# Altium footprint library Footprints.PcbLib: 67 footprints (part 1 of 5)
Each footprint in its own frame and in the unit in brackets; x right, y up, seen from the top. Pads: shape width x height; smd on the part's side, far side on the other; paste and mask are expansions set on the pad; w line width, h text height; cw(c..) or ccw(c..) is an arc to the next point about the centre after c.
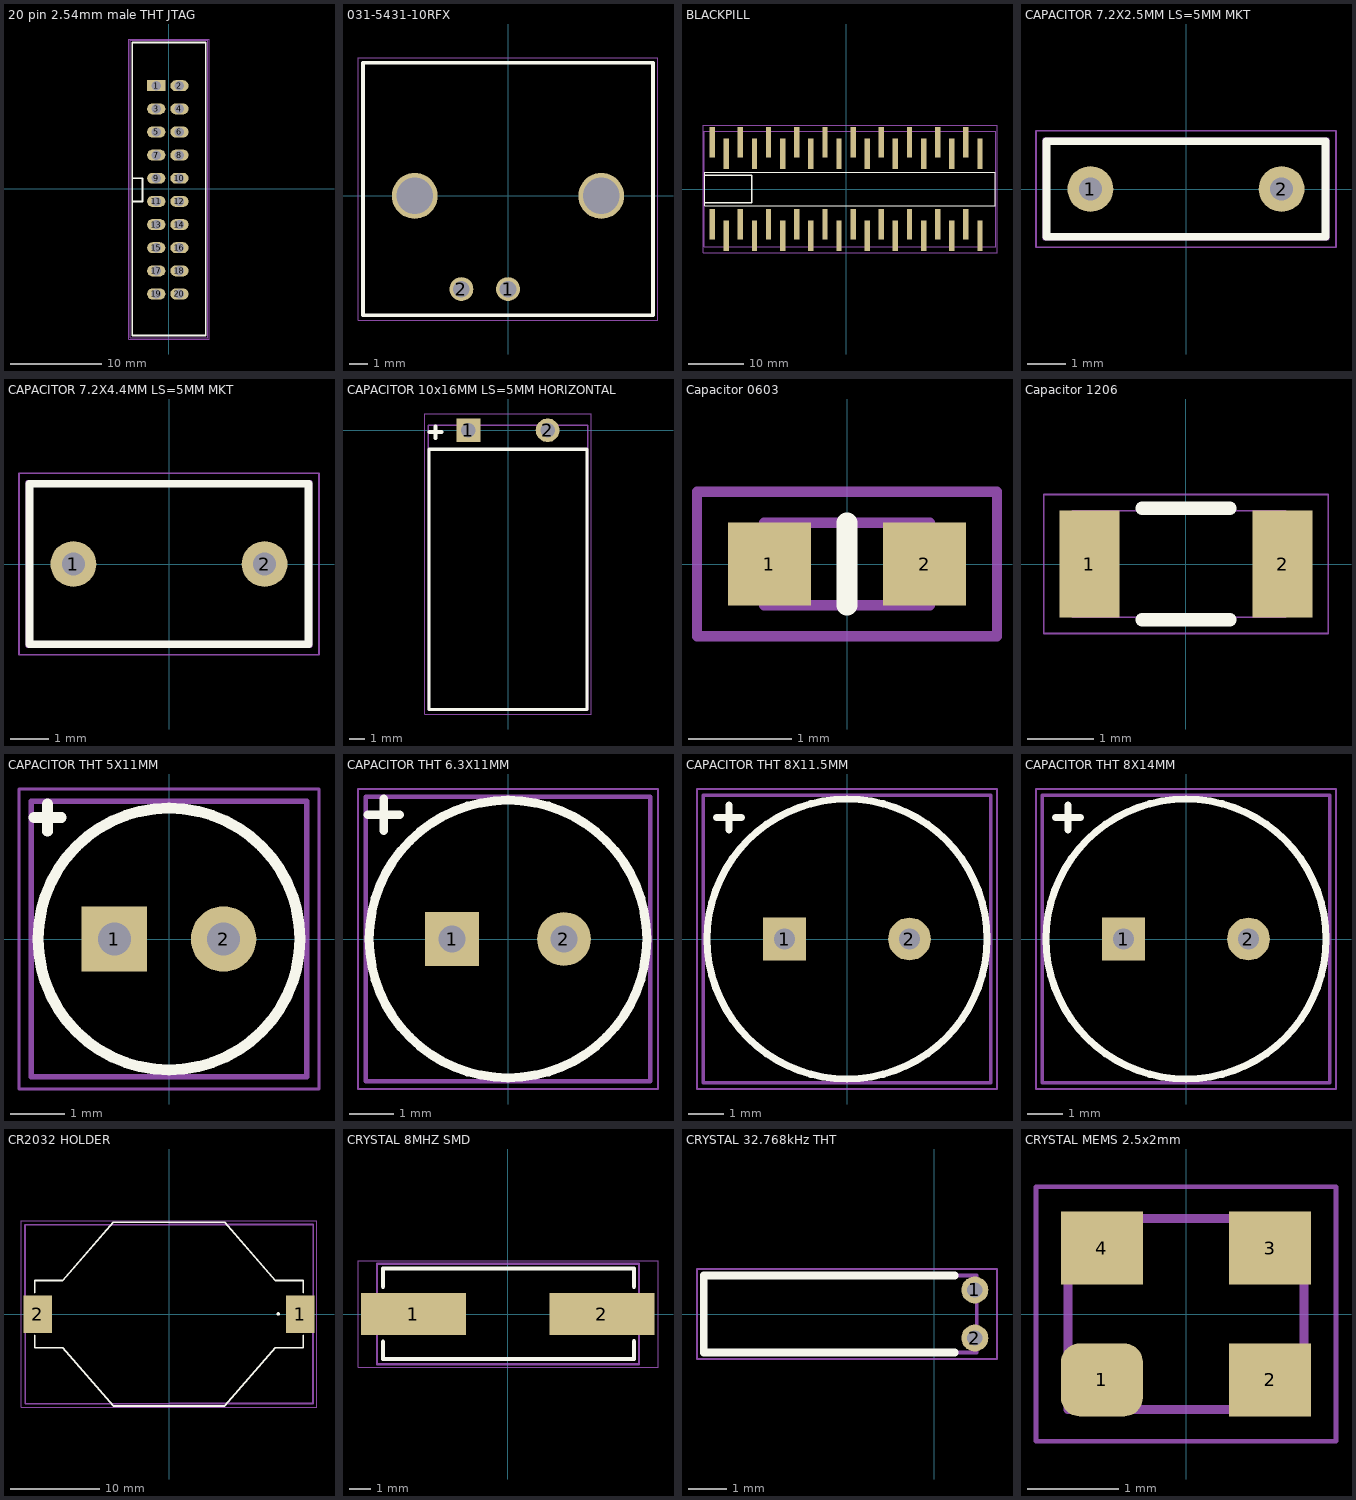
[diagram p0: the footprints below, top view; thin cyan lines are the x and y axes]

## 20 pin 2.54mm male THT JTAG [mm]
pads (20):
  rect 2x1.2 hole 1.02: 1(-1.4,11.325)
  oval 2x1.2 hole 1.02: 2(1.14,11.325) 3(-1.4,8.785) 4(1.14,8.785) 5(-1.4,6.245) 6(1.14,6.245) 7(-1.4,3.705) 8(1.14,3.705) 9(-1.4,1.165) 10(1.14,1.165) 11(-1.4,-1.375) 12(1.14,-1.375) 13(-1.4,-3.915) 14(1.14,-3.915) 15(-1.4,-6.455) 16(1.14,-6.455) 17(-1.4,-8.995) 18(1.14,-8.995) 19(-1.4,-11.535) 20(1.14,-11.535)
Top Overlay:
  lines w0.2: -3.937,-1.375 -2.912,-1.375 -2.912,1.165 -3.937,1.165 ; -4.025,-16.1 -4.025,16.075 4.025,16.075 4.025,-16.1 -4.025,-16.1
Placement:
  lines w0.1: -4.275,-16.35 -4.275,16.325 4.275,16.325 4.275,-16.35 -4.275,-16.35
  text "'.Designator'" at 0.6,-10 h1.8
Keep-Out:
  lines w0.05: -4.4,-16.475 -4.4,16.45 4.4,16.45 4.4,-16.475 -4.4,-16.475
3D body "idc-20_asm.STEP": height 8.5, standoff -3.7, extent -4.25,-16.375 4.25,16.325

## 031-5431-10RFX [mm]
pads (4):
  round 1.3 hole 0.9: 1(0,-5.08) 2(-2.54,-5.08)
  round 2.5 hole 2: ""(-5.08,0) ""(5.08,0)
Top Overlay:
  lines w0.2: -7.9,-6.5 7.9,-6.5 7.9,7.25 -7.9,7.25 -7.9,-6.5
Placement:
  lines w0.1: -7.9,-6.5 -7.9,7.25 7.9,7.25 7.9,-6.5 -7.9,-6.5
  text "'.Designator'" at -6.85,-0.675 h1.5
Keep-Out:
  lines w0.05: -8.175,-6.775 -8.175,7.525 8.175,7.525 8.175,-6.775 -8.175,-6.775
3D body "31-5431-10RFX.stp": height 16.71, standoff -4.08, extent -7.9,-6.5 7.9,28.2

## BLACKPILL [mm]
pads (40):
  rect 0.96x5.47 smd: 1(-24.13,-6.35) 2(-21.59,-8.446) 3(-19.05,-6.35) 4(-16.51,-8.446) 5(-13.97,-6.35) 6(-11.43,-8.446) 7(-8.89,-6.35) 8(-6.35,-8.446) 9(-3.81,-6.35) 10(-1.27,-8.446) 11(1.27,-6.35) 12(3.81,-8.446) 13(6.35,-6.35) 14(8.89,-8.446) 15(11.43,-6.35) 16(13.97,-8.446) 17(16.51,-6.35) 18(19.05,-8.446) 19(21.59,-6.35) 20(24.13,-8.446) 21(24.13,6.35) 22(21.59,8.446) 23(19.05,6.35) 24(16.51,8.446) 25(13.97,6.35) 26(11.43,8.446) 27(8.89,6.35) 28(6.35,8.446) 29(3.81,6.35) 30(1.27,8.446) 31(-1.27,6.35) 32(-3.81,8.446) 33(-6.35,6.35) 34(-8.89,8.446) 35(-11.43,6.35) 36(-13.97,8.446) 37(-16.51,6.35) 38(-19.05,8.446) 39(-21.59,6.35) 40(-24.13,8.446)
Top Overlay:
  lines w0.2: -25.475,-3 -25.475,3 26.925,3 26.925,-3 -25.475,-3
  lines w0.254: -25.425,-2.5 -17,-2.5 -17,2.5 -25.425,2.5
Placement:
  lines w0.1: -25.525,-10.4 26.975,-10.4 26.975,10.4 -25.525,10.4 -25.525,-10.4
  text "'.Designator'" at -21.25,-1.576 h6
Keep-Out:
  lines w0.05: -25.75,-11.45 27.2,-11.45 27.2,11.45 -25.75,11.45 -25.75,-11.45
3D body "User Library-minif4_board-1.step": height 14.66, standoff 9.6, extent -25.5,-10.395 27.04,10.385
3D body "10129380-910001ALF.stp": height 13.66, standoff 0, extent 0,4.983 25.4,9.813
3D body "10129380-910001ALF.stp": height 13.66, standoff 0, extent -25.4,4.983 0,9.813
3D body "10129380-910001ALF.stp": height 13.66, standoff 0, extent -25.4,-9.813 0,-4.983
3D body "10129380-910001ALF.stp": height 13.66, standoff 0, extent 0,-9.813 25.4,-4.983

## CAPACITOR 7.2X2.5MM LS=5MM MKT [mm]
pads (2):
  round 1.2 hole 0.6: 1(-2.5,0) 2(2.5,0)
Top Overlay:
  lines w0.2: -3.65,-1.25 3.65,-1.25 3.65,1.25 -3.65,1.25 -3.65,-1.25
Placement:
  lines w0.1: -3.7,-1.3 3.7,-1.3 3.7,1.3 -3.7,1.3 -3.7,-1.3
  text "'.Designator'" at -2.775,-0.275 h0.6
Keep-Out:
  lines w0.05: -3.925,-1.525 -3.925,1.525 3.925,1.525 3.925,-1.525 -3.925,-1.525
3D body "R82DC3220AA60K.step": height 6.6, standoff -5.5, extent -3.7,-1.3 3.7,1.305

## CAPACITOR 7.2X4.4MM LS=5MM MKT [mm]
pads (2):
  round 1.2 hole 0.6: 1(-2.5,0) 2(2.5,0)
Top Overlay:
  lines w0.2: -3.65,-2.1 3.65,-2.1 3.65,2.1 -3.65,2.1 -3.65,-2.1
Placement:
  lines w0.1: -3.7,-2.15 3.7,-2.15 3.7,2.15 -3.7,2.15 -3.7,-2.15
  text "'.Designator'" at -2.775,-0.275 h0.6
Keep-Out:
  lines w0.05: -3.925,-2.375 -3.925,2.375 3.925,2.375 3.925,-2.375 -3.925,-2.375
3D body "R82DC3220AA60K.step": height 6.6, standoff -5.5, extent -3.7,-1.3 3.7,1.305

## CAPACITOR 10x16MM LS=5MM HORIZONTAL [mm]
pads (2):
  rect 1.5x1.5 hole 0.9: 1(-2.5,0)
  round 1.5 hole 0.9: 2(2.5,0)
Top Overlay:
  lines w0.2: -4.975,-17.625 4.975,-17.625 4.975,-1.2 -4.975,-1.2 -4.975,-17.625
  lines w0.254: -4.95,-0.125 -4.2,-0.125 ; -4.575,-0.5 -4.575,-0.125 -4.575,0.25
Placement:
  lines w0.1: -5.025,-17.675 5.025,-17.675 5.025,0.325 -5.025,0.325 -5.025,-17.675
  text "'.Designator'" at 0.85,-15.4 h1.8
Keep-Out:
  lines w0.05: -5.25,-17.9 -5.25,1.025 5.25,1.025 5.25,-17.9 -5.25,-17.9
3D body "User Library-Cap electro 10x16x5_0mm RA.step": height 12.03, standoff -1.68, extent -5.025,-17.675 5.025,0.313

## Capacitor 0603 [mm]
pads (2):
  rect 0.8x0.8 smd: 1(-0.75,0) 2(0.75,0)
Top Overlay:
  lines w0.2: 0,-0.4 0,0.4
Placement:
  lines w0.1: -0.8,-0.4 0.8,-0.4 0.8,0.4 -0.8,0.4 -0.8,-0.4
  text "'.Designator'" at -0.225,-0.025 h0.3
Keep-Out:
  lines w0.1: -1.45,-0.7 -1.45,0.7 -0.675,0.7 1.45,0.7 1.45,-0.7 -1.45,-0.7
3D body "User Library-SMD CAPACITOR.step": height 0.75, standoff -0.04, extent -0.8,-0.4 0.8,0.4

## Capacitor 1206 [mm]
pads (2):
  rect 0.9x1.6 smd: 1(-1.45,0) 2(1.45,0)
Top Overlay:
  lines w0.2: -0.66,-0.838 0.66,-0.838 ; -0.66,0.838 0.66,0.838
Placement:
  lines w0.025: -1.702,-0.8 -1.702,0.8 1.498,0.8 1.498,-0.8 -1.702,-0.8
  text ".Designator" at -1.225,-0.175 h0.6
Keep-Out:
  lines w0.025: -2.134,-1.041 -2.134,1.041 2.134,1.041 2.134,-1.041 -2.134,-1.041
3D body "User Library-SMD CAPACITOR.step": height 0.75, standoff -0.03, extent -1.702,-0.8 1.498,0.8

## CAPACITOR THT 5X11MM [mm]
pads (2):
  rect 1.2x1.2 hole 0.6: 1(-1,0)
  round 1.2 hole 0.6: 2(1,0)
Top Overlay:
  circle w0.2: c0,0 r2.4
  lines w0.2: -2.475,2.225 -1.975,2.225 ; -2.225,1.975 -2.225,2.475
Placement:
  lines w0.1: -2.525,-2.525 2.525,-2.525 2.525,2.525 -2.525,2.525 -2.525,-2.525
  text "'.Designator'" at -2.1,-0.375 h1.2
Keep-Out:
  lines w0.05: -2.75,-2.75 -2.75,2.75 2.75,2.75 2.75,-2.75 -2.75,-2.75
3D body "User Library-Cap electro 5x11x2mm.step": height 14.53, standoff -0.27, extent -2.525,-2.525 2.526,2.526

## CAPACITOR THT 6.3X11MM [mm]
pads (2):
  rect 1.2x1.2 hole 0.6: 1(-1.25,0)
  round 1.2 hole 0.6: 2(1.25,0)
Top Overlay:
  circle w0.2: c0,0 r3.1
  lines w0.2: -3.125,2.775 -2.425,2.775 ; -2.775,2.425 -2.775,3.125
Placement:
  lines w0.1: -3.175,-3.175 3.175,-3.175 3.175,3.175 -3.175,3.175 -3.175,-3.175
  text "'.Designator'" at -2.1,-0.375 h1.2
Keep-Out:
  lines w0.05: -3.35,-3.35 -3.35,3.35 3.35,3.35 3.35,-3.35 -3.35,-3.35
3D body "User Library-Cap electro 6_3x11x2mm.step": height 14.53, standoff -0.27, extent -3.175,-3.175 3.176,3.176

## CAPACITOR THT 8X11.5MM [mm]
pads (2):
  rect 1.2x1.2 hole 0.6: 1(-1.75,0)
  round 1.2 hole 0.6: 2(1.75,0)
Top Overlay:
  circle w0.2: c0,0 r3.92
  lines w0.2: -3.65,3.4 -2.95,3.4 ; -3.3,3.05 -3.3,3.75
Placement:
  lines w0.1: -4.025,-4.025 4.025,-4.025 4.025,4.025 -4.025,4.025 -4.025,-4.025
  text "'.Designator'" at -2.1,-0.375 h1.2
Keep-Out:
  lines w0.05: -4.2,-4.2 -4.2,4.2 4.2,4.2 4.2,-4.2 -4.2,-4.2
3D body "User Library-Cap electro 8x11_5x3_5mm.step": height 15.03, standoff -0.48, extent -4.025,-4.025 4.026,4.026

## CAPACITOR THT 8X14MM [mm]
pads (2):
  rect 1.2x1.2 hole 0.6: 1(-1.75,0)
  round 1.2 hole 0.6: 2(1.75,0)
Top Overlay:
  circle w0.2: c0,0 r3.92
  lines w0.2: -3.65,3.4 -2.95,3.4 ; -3.3,3.05 -3.3,3.75
Placement:
  lines w0.1: -4.025,-4.025 4.025,-4.025 4.025,4.025 -4.025,4.025 -4.025,-4.025
  text "'.Designator'" at -2.1,-0.375 h1.2
Keep-Out:
  lines w0.05: -4.2,-4.2 -4.2,4.2 4.2,4.2 4.2,-4.2 -4.2,-4.2
3D body "User Library-CE_R150_D320_H570.step": height 17.4, standoff 0.1, extent -4.1,-4.1 4.1,4.1

## CR2032 HOLDER [mm]
pads (2):
  rect 3.2x4.2 smd: 1(14.65,0) 2(-14.65,0)
Top Overlay:
  lines w0.2: -15,-2.4 -15,-3.75 -11.882,-3.75 -6.228,-10.25 0,-10.25 6.228,-10.25 11.882,-3.75 15,-3.75 15,-2.4 ; -15,2.4 -15,3.75 -11.882,3.75 -6.228,10.25 0,10.25 6.228,10.25 11.882,3.75 15,3.75 15,2.4 ; 12.2,-0.075 cw(c12.2,0.025) 12.2,0.125 cw(c12.2,0.025) 12.2,-0.075
Placement:
  lines w0.2: -16.075,-0.025 -16.075,9.975 ; -16.05,-10 -16.05,0 ; -16.05,9.975 -0.025,9.975 ; -16.025,-10 0,-10 ; 0.025,-9.975 16.05,-9.975 ; 0.05,10 16.075,10 ; 16.075,-9.975 16.075,0.025 ; 16.1,0 16.1,10
  text "'.Designator'" at -10.125,-0.55 h1.8
Keep-Out:
  lines w0.1: -16.5,-10.425 -16.5,10.45 16.5,10.45 16.5,-10.425 -16.5,-10.425
3D body "Mechanical CR2032.step": height 5.3, standoff 0, extent -16,-10 16,10

## CRYSTAL 8MHZ SMD [mm]
pads (2):
  rect 5x2 smd: 1(-4.5,0) 2(4.5,0)
Top Overlay:
  lines w0.2: -5.95,-1.325 -5.95,-2.15 6.025,-2.15 6.025,-1.3 ; -5.95,1.3 -5.95,2.175 6.025,2.175 6.025,1.3
Placement:
  lines w0.1: 6.25,-2.4 -6.25,-2.4 -6.25,2.4 6.25,2.4 ; 6.275,-2.4 6.275,2.4
  text "'.Designator'" at -5,0 h1.2
Keep-Out:
  lines w0.05: -7.15,-2.55 -7.15,0 -7.15,2.55 7.175,2.55 7.175,0 7.175,-2.55 -7.15,-2.55
3D body "8MHZ_SMD.step": height 4, standoff 0, extent -6.25,-2.4 6.25,2.4

## CRYSTAL 32.768kHz THT [mm]
pads (2):
  round 0.7 hole 0.4: 1(1.05,0.625) 2(1.05,-0.625)
Top Overlay:
  lines w0.2: 0.525,-1 -6,-1 -6,1 0.525,1
Placement:
  lines w0.1: -6,-1 -6,1 1.1,1 1.1,-1 -6,-1
  text "'.Designator'" at -5.5,-0.35 h0.9
Keep-Out:
  lines w0.05: -6.175,-1.175 1.625,-1.175 1.625,1.175 -6.175,1.175 -6.175,-1.175
3D body "Crystals 32kHz.step": height 2, standoff -2, extent -6,-1 1.14,1

## CRYSTAL MEMS 2.5x2mm [mm]
pads (4):
  rrect50% 0.9x0.8 smd: 1(-0.925,-0.725)
  rect 0.9x0.8 smd: 2(0.925,-0.725) 3(0.925,0.725) 4(-0.925,0.725)
Placement:
  lines w0.1: -1.3,-1.05 1.3,-1.05 1.3,1.05 -1.3,1.05 -1.3,-1.05
  text ".Designator" at -1.2,-0.325 h0.9
Keep-Out:
  lines w0.05: -1.65,-1.4 1.65,-1.4 1.65,1.4 -1.65,1.4 -1.65,-1.4
3D body "User Library-Crystal NDK NX2520SA series.step": height 0.55, standoff 0, extent -1.3,-1.05 1.3,1.05